# Altium footprint library AD_Lib.PcbLib: 508 footprints (part 5 of 32)
Each footprint in its own frame and in the unit in brackets; x right, y up, seen from the top. Pads: shape width x height; smd on the part's side, far side on the other; paste and mask are expansions set on the pad; w line width, h text height; cw(c..) or ccw(c..) is an arc to the next point about the centre after c.
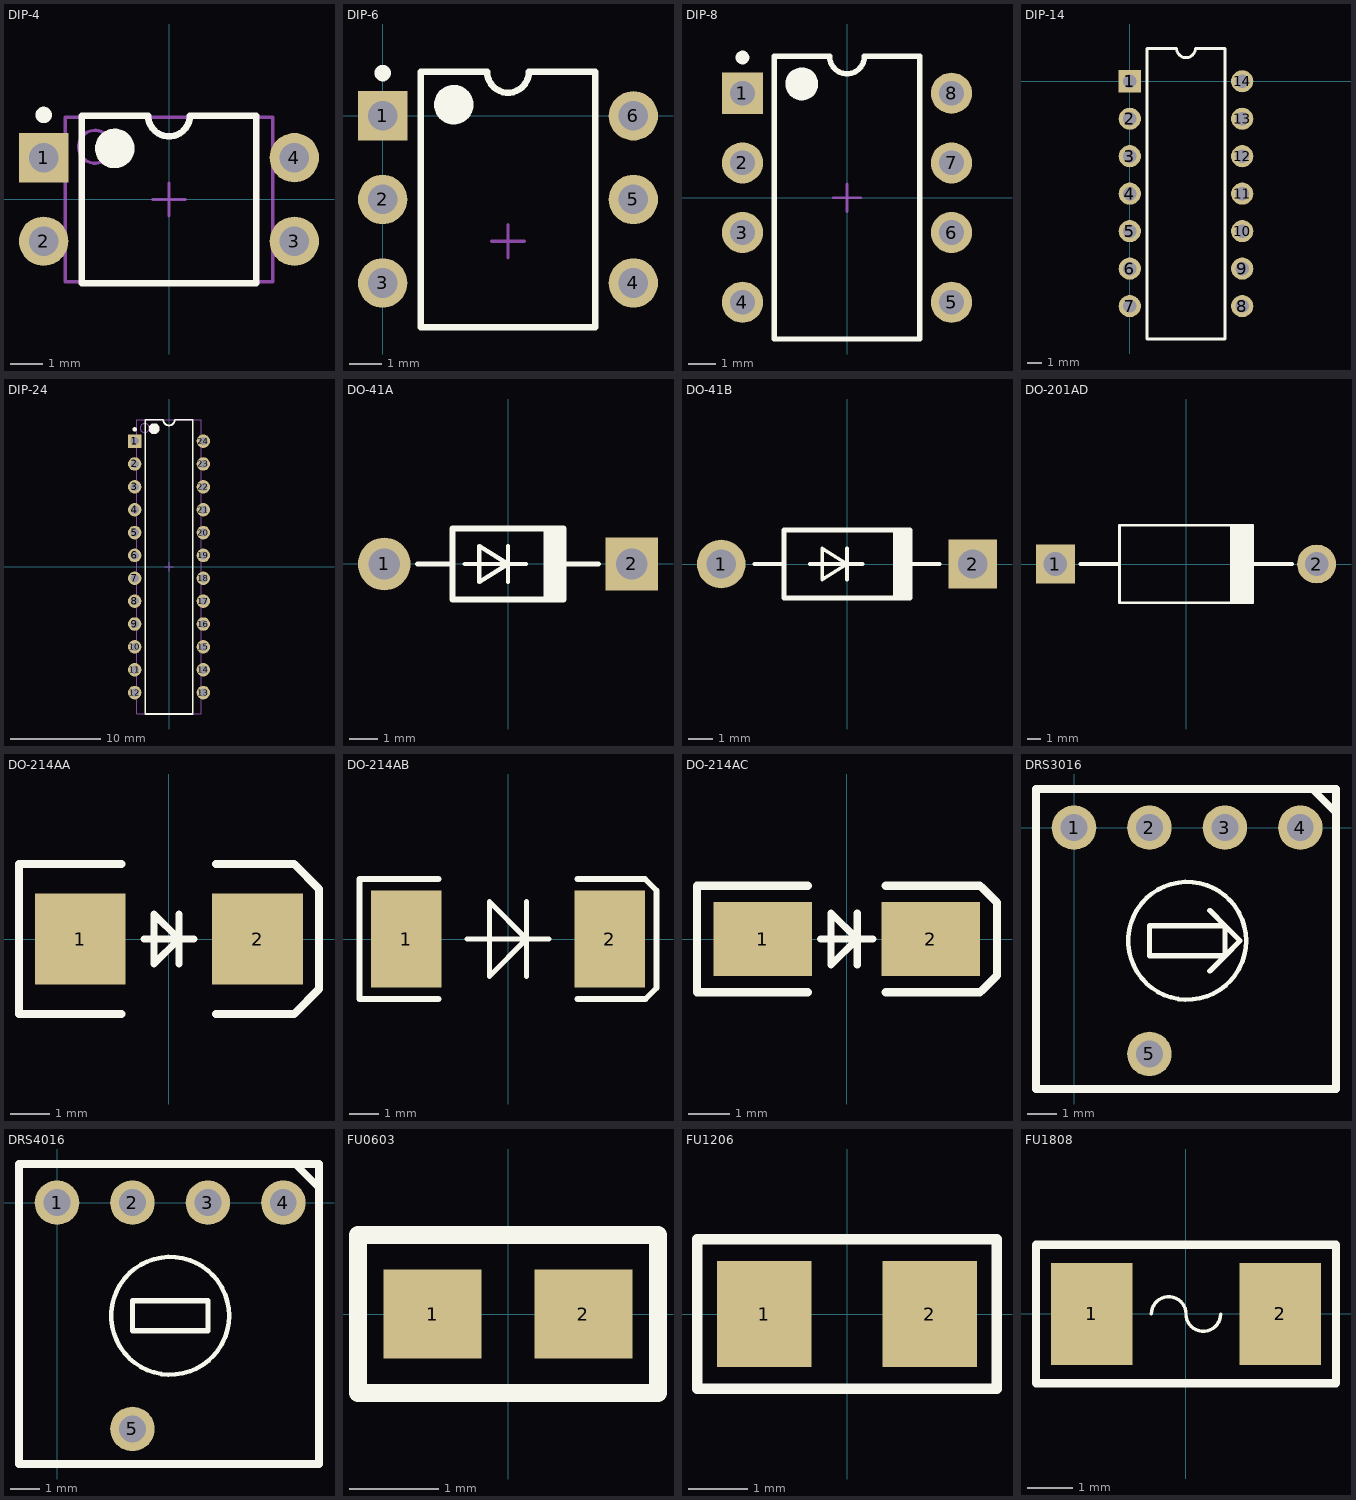
[diagram p4: the footprints below, top view; thin cyan lines are the x and y axes]

## DIP-4 [mm] "DIP; 4 Leads; Row Spacing 7.62 mm; Pitch 2.54 mm"
height 5.6
pads (4):
  rect 1.5x1.5 hole 0.9: 1(-3.81,1.27)
  round 1.5 hole 0.9: 2(-3.81,-1.27) 3(3.81,-1.27) 4(3.81,1.27)
Top Overlay:
  circle w0.6: c-1.65,1.55 r0.3
  circle w0.25: c-3.81,2.57 r0.125
  lines w0.2: -2.65,-2.55 2.65,-2.55 2.65,2.55 0.635,2.55 cw(c0,2.55) -0.635,2.55 -2.65,2.55 -2.65,-2.55
Mechanical 13:
  circle w0.1: c-2.25,1.6 r0.5
  lines w0.1: -3.15,-2.5 3.15,-2.5 3.15,2.5 -3.15,2.5 -3.15,-2.5
Mechanical 15:
  lines w0.1: -0.5,0 0.5,0 ; 0,-0.5 0,0.5
3D body: height 5.6, standoff 0, extent -3.15,-2.5 3.15,2.5

## DIP-6 [mm] "DIP; 8 Leads; Row Spacing 7.62 mm; Pitch 2.54 mm"
height 5.08
pads (6):
  rect 1.5x1.5 hole 0.9: 1(0,0)
  round 1.5 hole 0.9: 2(0,-2.54) 3(0,-5.08) 4(7.62,-5.08) 5(7.62,-2.54) 6(7.62,0)
Top Overlay:
  circle w0.6: c2.16,0.34 r0.3
  circle w0.25: c0,1.3 r0.125
  lines w0.2: 1.16,-6.42 1.16,1.34 3.175,1.34 ccw(c3.81,1.34) 4.445,1.34 6.46,1.34 6.46,-6.42 1.16,-6.42
Mechanical 15:
  lines w0.1: 3.31,-3.81 4.31,-3.81 ; 3.81,-4.31 3.81,-3.31

## DIP-8 [mm] "DIP; 8 Leads; Row Spacing 7.62 mm; Pitch 2.54 mm"
height 5.08
pads (8):
  rect 1.5x1.5 hole 0.9: 1(-3.81,3.81)
  round 1.5 hole 0.9: 2(-3.81,1.27) 3(-3.81,-1.27) 4(-3.81,-3.81) 5(3.81,-3.81) 6(3.81,-1.27) 7(3.81,1.27) 8(3.81,3.81)
Top Overlay:
  circle w0.6: c-1.65,4.15 r0.3
  circle w0.25: c-3.81,5.11 r0.125
  lines w0.2: -2.65,-5.15 2.65,-5.15 2.65,5.15 0.635,5.15 cw(c0,5.15) -0.635,5.15 -2.65,5.15 -2.65,-5.15
Mechanical 15:
  lines w0.1: -0.5,0 0.5,0 ; 0,-0.5 0,0.5

## DIP-14 [mm] "DIP, Plastic; 14 Leads; Row Spacing 7.62 mm; Pitch 2.54 mm"
height 4.32
pads (14):
  rect 1.5x1.5 hole 0.9: 1(0,0)
  round 1.5 hole 0.9: 2(0,-2.54) 3(0,-5.08) 4(0,-7.62) 5(0,-10.16) 6(0,-12.7) 7(0,-15.24) 8(7.62,-15.24) 9(7.62,-12.7) 10(7.62,-10.16) 11(7.62,-7.62) 12(7.62,-5.08) 13(7.62,-2.54) 14(7.62,0)
Top Overlay:
  lines w0.2: 1.16,-17.47 1.16,2.23 3.175,2.23 ccw(c3.81,2.23) 4.445,2.23 6.46,2.23 6.46,-17.47 1.16,-17.47

## DIP-24 [mm] "DIP, 24-Leads, Row Spacing 7.62mm, Pitch 2.54mm, Body 30.55x6.99mm"
height 5.08
pads (24):
  rect 1.5x1.5 hole 0.9: 1(-3.81,13.97)
  round 1.5 hole 0.9: 2(-3.81,11.43) 3(-3.81,8.89) 4(-3.81,6.35) 5(-3.81,3.81) 6(-3.81,1.27) 7(-3.81,-1.27) 8(-3.81,-3.81) 9(-3.81,-6.35) 10(-3.81,-8.89) 11(-3.81,-11.43) 12(-3.81,-13.97) 13(3.81,-13.97) 14(3.81,-11.43) 15(3.81,-8.89) 16(3.81,-6.35) 17(3.81,-3.81) 18(3.81,-1.27) 19(3.81,1.27) 20(3.81,3.81) 21(3.81,6.35) 22(3.81,8.89) 23(3.81,11.43) 24(3.81,13.97)
Top Overlay:
  circle w0.25: c-3.81,15.27 r0.125
  circle w0.6: c-1.65,15.35 r0.3
  lines w0.2: -2.65,-16.35 -2.65,16.35 -0.635,16.35 ccw(c0,16.35) 0.635,16.35 2.65,16.35 2.65,-16.35 -2.65,-16.35
Mechanical 13:
  circle w0.1: c-2.7,15.425 r0.5
  lines w0.1: -3.6,-16.325 -3.6,16.325 3.6,16.325 3.6,-16.325 -3.6,-16.325
Mechanical 15:
  lines w0.1: -0.5,0 0.5,0 ; 0,-0.5 0,0.5
3D body: height 5.08, standoff 0, extent -3.6,-16.325 3.6,16.325

## DO-41A [mm] "Diode, Axial; Body 3.9 x 2.5 mm (LxDia. max), Lead Dia. 0.8 mm (max)"
height 2.5
pads (2):
  round 1.85 hole 1.1: 1(-4.35,0)
  rect 1.85x1.85 hole 1.1: 2(4.35,0)
Top Overlay:
  rectangle: 1.25,-1.25 2.05,1.25
  lines w0.152: -1.524,0 0,0 ; 0,-0.635 0,0 ; 0,0.635 0,0 ; 0.635,0 0,0 ; 0,0 -1.016,-0.635 -1.016,0.635 0,0
  lines w0.178: -3.175,0 -1.95,0 ; 1.905,0 3.175,0
  lines w0.2: 1.95,-1.25 -1.95,-1.25 -1.95,1.25 1.95,1.25

## DO-41B [mm] "Diode, Axial; Body 5.2 x 2.7 mm (LxDia. max), Lead Dia. 0.86 mm (max)"
height 2.7
pads (2):
  round 2 hole 1.2: 1(-5.18,0)
  rect 2x2 hole 1.2: 2(5.18,0)
Top Overlay:
  rectangle: 1.9,-1.4 2.7,1.4
  lines w0.152: -1.524,0 0,0 ; 0,-0.635 0,0 ; 0,0.635 0,0 ; 0.635,0 0,0 ; 0,0 -1.016,-0.635 -1.016,0.635 0,0
  lines w0.178: -3.81,0 -2.6,0 ; 2.54,0 3.81,0
  lines w0.2: 2.6,-1.4 -2.6,-1.4 -2.6,1.4 2.6,1.4

## DO-201AD [mm] "Diode, Axial; Body 9.5 x 5.3 mm (LxDia. max), Lead Dia. 1.32 mm (max)"
height 5.4
pads (2):
  rect 2.8x2.8 hole 1.7: 1(-9.42,0)
  round 2.8 hole 1.7: 2(9.42,0)
Top Overlay:
  rectangle: 3.175,-2.8 4.9,2.8
  lines w0.2: 4.8,-2.8 -4.8,-2.8 -4.8,2.8 4.8,2.8
  lines w0.254: -7.62,0 -4.8,0 ; 4.826,0 7.646,0

## DO-214AA [mm] "DO-214-AA/SMB"
height 2.54
pads (2):
  rect 2.3x2.3 smd: 1(-2.25,0) 2(2.25,0)
Top Overlay:
  lines w0.178: -0.635,0 0.635,0 ; 0.254,-0.635 0.254,0.635 ; -0.381,-0.635 -0.381,0.635 0.254,0 -0.381,-0.635
  lines w0.2: -1.2,-1.9 -3.8,-1.9 -3.8,1.9 -1.2,1.9 ; 1.2,-1.9 3.18,-1.9 3.81,-1.27 3.81,1.27 3.18,1.9 1.2,1.9

## DO-214AB [mm] "DO-214-AB/SMC"
height 2.57
pads (2):
  rect 2.4x3.3 smd: 1(-3.475,0) 2(3.475,0)
Top Overlay:
  lines w0.178: -1.397,0 1.397,0 ; 0.635,-1.27 0.635,1.27 ; -0.635,-1.27 0.635,0 -0.635,1.27 -0.635,-1.27
  lines w0.2: -2.375,-2.05 -5.075,-2.05 -5.075,2.05 -2.375,2.05 ; 2.375,-2.05 4.699,-2.05 5.075,-1.674 5.075,1.656 4.681,2.05 2.375,2.05

## DO-214AC [mm] "DO-214-AC/SMA"
height 2.44
pads (2):
  rect 2.4x1.8 smd: 1(-2.05,0) 2(2.05,0)
Top Overlay:
  lines w0.178: -0.635,0 0.635,0 ; 0.254,-0.635 0.254,0.635 ; -0.381,-0.635 -0.381,0.635 0.254,0 -0.381,-0.635
  lines w0.2: -0.95,-1.3 -3.65,-1.3 -3.65,1.3 -0.95,1.3 ; 0.95,-1.3 3.244,-1.3 ; 0.95,1.3 3.244,1.3 ; 3.284,-1.27 3.665,-0.889 3.665,0.889 3.284,1.27

## DRS3016 [mm] "旋转编码器，无旋杆"
height 1.5
pads (5):
  round 1.5 hole 0.9: 1(0,0) 2(2.54,0) 3(5.08,0) 4(7.62,0) 5(2.54,-7.62)
Top Overlay:
  circle w0.152: c3.81,-3.81 r1.984
  lines w0.178: 4.572,-4.826 5.08,-4.318 ; 4.572,-2.794 5.08,-3.302 ; 5.08,-4.318 5.588,-3.81 5.08,-3.302 ; 5.08,-4.318 5.08,-3.302 ; 5.08,-4.318 2.54,-4.318 2.54,-3.302 5.08,-3.302
  lines w0.254: 7.82,1.3 8.02,1.3 8.82,0.5 8.82,0.3 ; -1.28,-8.8 -1.28,1.3 8.82,1.3 8.82,-8.8 -1.28,-8.8

## DRS4016 [mm] "旋转编码器，有旋杆"
height 1.5
pads (5):
  round 1.5 hole 0.9: 1(0,0) 2(2.54,0) 3(5.08,0) 4(7.62,0) 5(2.54,-7.62)
Top Overlay:
  circle w0.152: c3.81,-3.81 r1.984
  lines w0.178: 2.54,-4.318 2.54,-3.302 5.08,-3.302 5.08,-4.318 2.54,-4.318
  lines w0.254: 7.82,1.3 8.02,1.3 8.82,0.5 8.82,0.3 ; -1.28,-8.8 8.82,-8.8 8.82,1.3 -1.28,1.3 -1.28,-8.8

## FU0603 [mm] "贴片熔丝"
height 1.1
pads (2):
  rect 1.1x1 smd: 1(-0.85,0) 2(0.85,0)
Top Overlay:
  lines w0.2: -1.69,-0.889 -1.69,0.889 1.69,0.889 1.69,-0.889 -1.69,-0.889

## FU1206 [mm] "公制3216；英制1206；"
height 0.71
pads (2):
  rect 1.6x1.8 smd: 1(-1.4,0) 2(1.4,0)
Top Overlay:
  lines w0.178: -2.54,-1.27 2.54,-1.27 2.54,1.27 -2.54,1.27 -2.54,-1.27

## FU1808 [mm] "Chip Fuse; Body 4.5 x 2.0 mm (LxW typ)"
height 2.03
pads (2):
  rect 1.8x2.25 smd: 1(-2.075,0) 2(2.075,0)
Top Overlay:
  lines w0.076: -0.762,0 cw(c-0.381,0) 0,0 ccw(c0.381,0) 0.762,0
  lines w0.178: -3.302,-1.524 3.302,-1.524 3.302,1.524 -3.302,1.524 -3.302,-1.524